# Altium footprint library ref-packages-longpad.PCBLIB: 1527 footprints (part 47 of 103)
Each footprint in its own frame and in the unit in brackets; x right, y up, seen from the top. Pads: shape width x height; smd on the part's side, far side on the other; paste and mask are expansions set on the pad; w line width, h text height; cw(c..) or ccw(c..) is an arc to the next point about the centre after c.
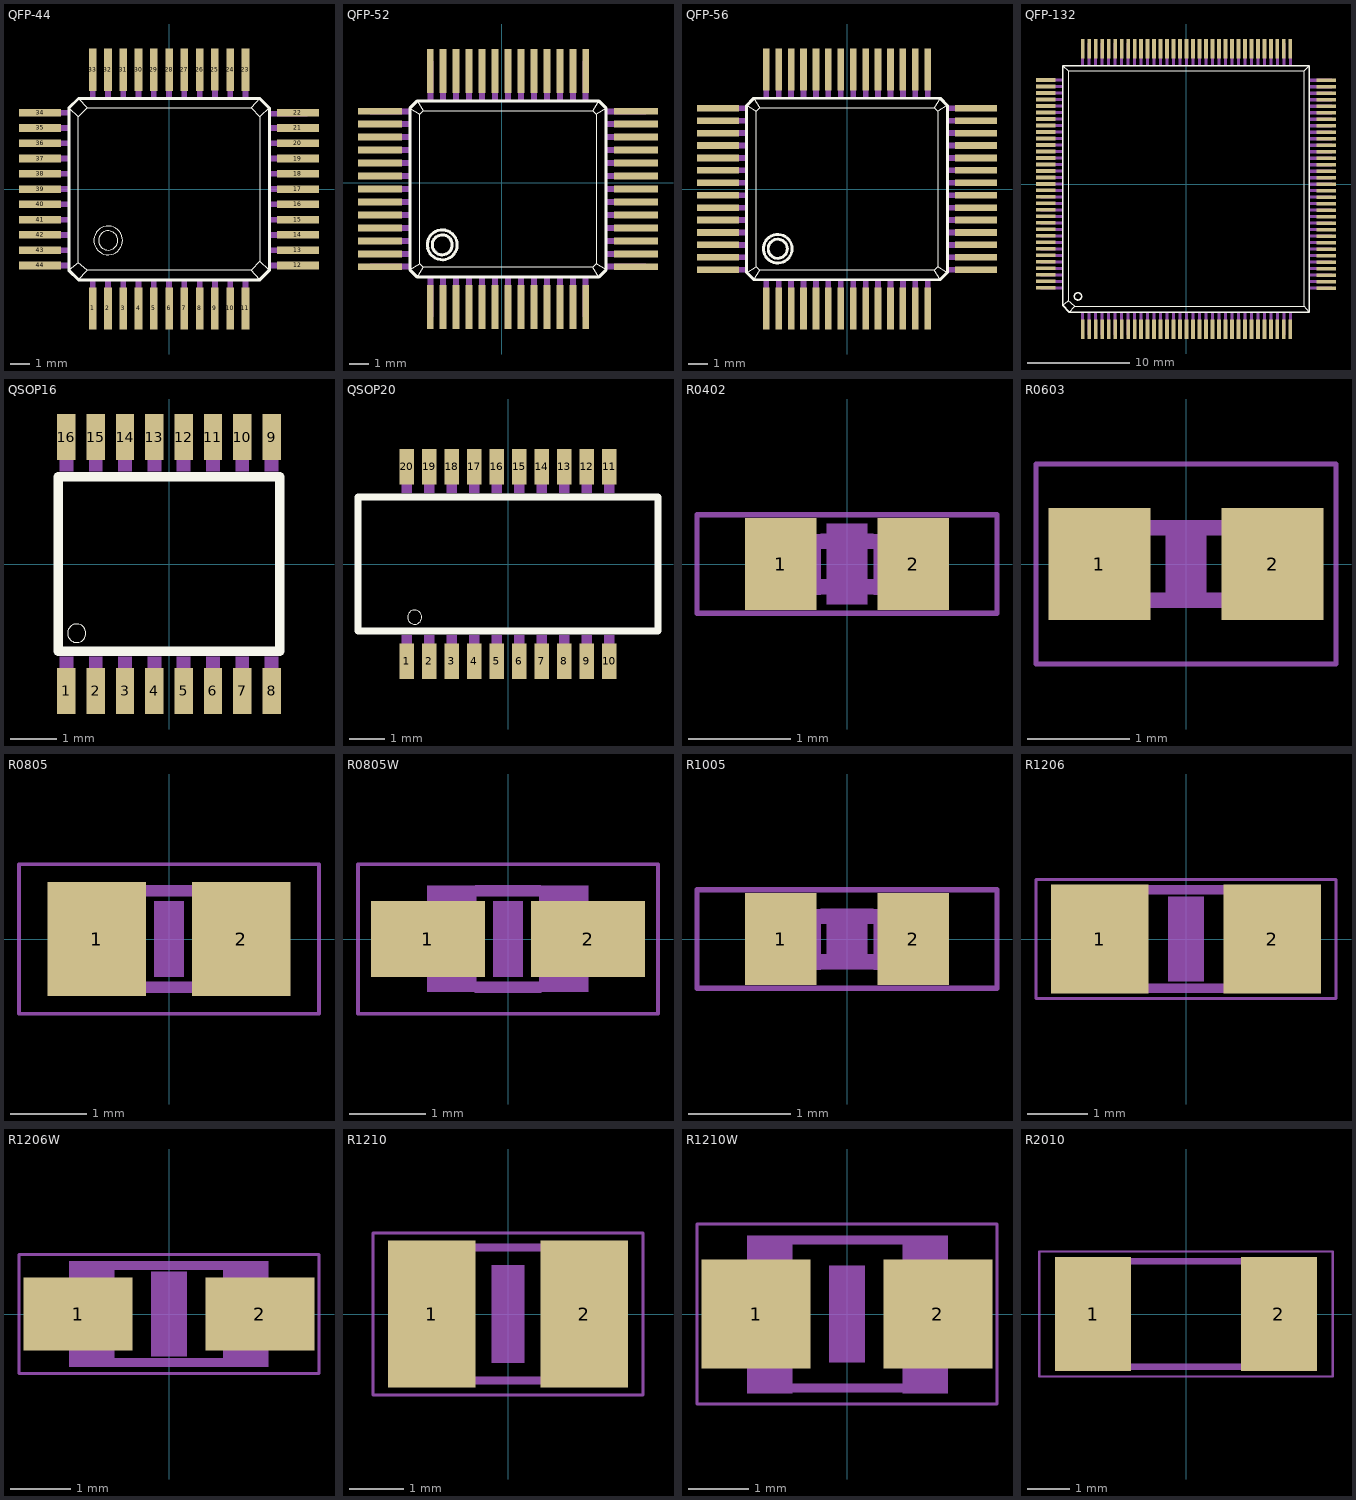
[diagram p46: the footprints below, top view; thin cyan lines are the x and y axes]

## QFP-44 [mm]
pads (44):
  rect 0.4x2.2 smd: 1(-4,-6.25) 2(-3.2,-6.25) 3(-2.4,-6.25) 4(-1.6,-6.25) 5(-0.8,-6.25) 6(0,-6.25) 7(0.8,-6.25) 8(1.6,-6.25) 9(2.4,-6.24) 10(3.2,-6.25) 11(4,-6.25) 23(4,6.25) 24(3.2,6.25) 25(2.4,6.26) 26(1.6,6.25) 27(0.8,6.25) 28(0,6.25) 29(-0.8,6.25) 30(-1.6,6.25) 31(-2.4,6.25) 32(-3.2,6.25) 33(-4,6.25)
  rect 2.2x0.4 smd: 12(6.75,-4) 13(6.75,-3.2) 14(6.75,-2.4) 15(6.75,-1.6) 16(6.75,-0.8) 17(6.75,0) 18(6.75,0.8) 19(6.75,1.6) 20(6.74,2.4) 21(6.75,3.2) 22(6.75,4) 34(-6.75,4) 35(-6.75,3.2) 36(-6.76,2.4) 37(-6.75,1.6) 38(-6.75,0.8) 39(-6.75,0) 40(-6.75,-0.8) 41(-6.75,-1.6) 42(-6.75,-2.4) 43(-6.75,-3.2) 44(-6.75,-4)
Top Overlay:
  circle w0.051: c-3.19,-2.69 r0.75
  circle w0.051: c-3.19,-2.69 r0.5
  lines w0.051: -5.25,-4.25 -4.75,-3.85 ; -5.25,4.25 -4.75,3.79 ; -4.75,-4.75 -4.29,-4.25 ; -4.75,4.75 -4.29,4.25 ; 4.75,-4.75 4.29,-4.25 ; 4.75,4.75 4.29,4.25 ; 5.25,-4.25 4.75,-3.79 ; 5.25,4.25 4.75,3.79 ; -4.75,-3.85 -4.75,3.79 ; -4.75,-3.85 -4.29,-4.25 ; -4.75,3.79 -4.29,4.25 ; -4.29,-4.25 4.29,-4.25 ; -4.29,4.25 4.29,4.25 ; 4.29,-4.25 4.75,-3.79 ; 4.29,4.25 4.75,3.79 ; 4.75,-3.79 4.75,3.79
  lines w0.152: -5.25,-4.25 -4.75,-4.75 4.75,-4.75 5.25,-4.25 5.25,4.25 4.75,4.75 -4.75,4.75 -5.25,4.25 -5.25,-4.25
Mechanical 16:
  rectangle: -4.15,4.75 -3.85,6.75
  rectangle: -3.35,4.75 -3.05,6.75
  rectangle: -2.55,4.75 -2.25,6.75
  rectangle: -1.75,4.75 -1.45,6.75
  rectangle: -0.95,4.75 -0.65,6.75
  rectangle: -0.15,4.75 0.15,6.75
  rectangle: 0.65,4.75 0.95,6.75
  rectangle: 1.45,4.75 1.75,6.75
  rectangle: 2.25,4.75 2.55,6.75
  rectangle: 3.05,4.75 3.35,6.75
  rectangle: 3.85,4.75 4.15,6.75
  rectangle: 5.25,3.79 7.25,4.09
  rectangle: 5.25,3.05 7.25,3.35
  rectangle: 5.25,2.25 7.25,2.55
  rectangle: 5.25,1.45 7.25,1.75
  rectangle: 5.25,0.65 7.25,0.95
  rectangle: 5.25,-0.15 7.25,0.15
  rectangle: 5.25,-0.95 7.25,-0.65
  rectangle: 5.25,-1.75 7.25,-1.45
  rectangle: 5.25,-2.55 7.25,-2.25
  rectangle: 5.25,-3.35 7.25,-3.05
  rectangle: 5.25,-4.15 7.25,-3.85
  rectangle: 3.85,-6.75 4.15,-4.75
  rectangle: 3.05,-6.75 3.35,-4.75
  rectangle: 2.25,-6.75 2.55,-4.75
  rectangle: 1.45,-6.75 1.75,-4.75
  rectangle: 0.65,-6.75 0.95,-4.75
  rectangle: -0.15,-6.75 0.15,-4.75
  rectangle: -0.95,-6.75 -0.65,-4.75
  rectangle: -1.75,-6.75 -1.45,-4.75
  rectangle: -2.55,-6.75 -2.25,-4.75
  rectangle: -3.35,-6.75 -3.05,-4.75
  rectangle: -4.15,-6.75 -3.85,-4.75
  rectangle: -7.25,-4.15 -5.25,-3.85
  rectangle: -7.25,-3.35 -5.25,-3.05
  rectangle: -7.25,-2.55 -5.25,-2.25
  rectangle: -7.25,-1.75 -5.25,-1.45
  rectangle: -7.25,-0.95 -5.25,-0.65
  rectangle: -7.25,-0.15 -5.25,0.15
  rectangle: -7.25,0.65 -5.25,0.95
  rectangle: -7.25,1.45 -5.25,1.75
  rectangle: -7.25,2.25 -5.25,2.55
  rectangle: -7.25,3.05 -5.25,3.35
  rectangle: -7.25,3.849 -5.25,4.149

## QFP-52 [mm]
pads (52):
  rect 0.35x2.2 smd: 1(-3.575,-6.25) 2(-2.925,-6.25) 3(-2.275,-6.25) 4(-1.625,-6.25) 5(-0.975,-6.25) 6(-0.325,-6.25) 7(0.325,-6.25) 8(0.975,-6.25) 9(1.625,-6.25) 10(2.275,-6.25) 11(2.925,-6.25) 12(3.575,-6.25) 13(4.225,-6.25) 27(4.225,5.6) 28(3.575,5.6) 29(2.925,5.6) 30(2.275,5.6) 31(1.625,5.6) 32(0.975,5.6) 33(0.325,5.6) 34(-0.325,5.6) 35(-0.975,5.6) 36(-1.625,5.6) 37(-2.275,5.6) 38(-2.925,5.6) 39(-3.575,5.6)
  rect 2.2x0.35 smd: 14(6.75,-4.225) 15(6.75,-3.575) 16(6.75,-2.925) 17(6.75,-2.275) 18(6.75,-1.625) 19(6.75,-0.975) 20(6.75,-0.325) 21(6.75,0.325) 22(6.75,0.975) 23(6.75,1.625) 24(6.75,2.275) 25(6.75,2.925) 26(6.75,3.575) 40(-6.1,3.575) 41(-6.1,2.925) 42(-6.1,2.275) 43(-6.1,1.625) 44(-6.1,0.975) 45(-6.1,0.325) 46(-6.1,-0.325) 47(-6.1,-0.975) 48(-6.1,-1.625) 49(-6.1,-2.275) 50(-6.1,-2.925) 51(-6.1,-3.575) 52(-6.1,-4.225)
Top Overlay:
  circle w0.152: c-2.974,-3.127 r0.75
  circle w0.152: c-2.974,-3.127 r0.501
  lines w0.051: -4.6,-4.375 -4.1,-4.075 ; -4.6,3.725 -4.1,3.425 ; -4.225,4.1 -3.925,3.6 ; -4.224,-4.751 -3.925,-4.25 ; 4.874,-4.751 4.575,-4.25 ; 4.875,4.1 4.575,3.6 ; 5.25,-4.375 4.75,-4.075 ; 5.25,3.725 4.75,3.425 ; -4.1,-4.075 -4.1,3.425 ; -4.1,-4.075 -3.925,-4.25 ; -4.1,3.425 -3.925,3.6 ; -3.925,-4.25 4.575,-4.25 ; -3.925,3.6 4.575,3.6 ; 4.575,-4.25 4.75,-4.075 ; 4.575,3.6 4.75,3.425 ; 4.75,-4.075 4.75,3.425
  lines w0.152: -4.6,-4.375 -4.6,3.725 -4.225,4.1 4.875,4.1 5.25,3.725 5.25,-4.375 4.874,-4.751 -4.224,-4.751 -4.6,-4.375
Mechanical 16:
  rectangle: -3.725,4.1 -3.425,6.1
  rectangle: -3.075,4.1 -2.775,6.1
  rectangle: -2.425,4.1 -2.125,6.1
  rectangle: -1.775,4.1 -1.475,6.1
  rectangle: -1.125,4.1 -0.825,6.1
  rectangle: -0.475,4.1 -0.175,6.1
  rectangle: 0.175,4.1 0.475,6.1
  rectangle: 0.825,4.1 1.125,6.1
  rectangle: 1.475,4.1 1.775,6.1
  rectangle: 2.125,4.1 2.425,6.1
  rectangle: 2.775,4.1 3.075,6.1
  rectangle: 3.425,4.1 3.725,6.1
  rectangle: 4.075,4.1 4.375,6.1
  rectangle: 5.25,3.425 7.25,3.725
  rectangle: 5.25,2.775 7.25,3.075
  rectangle: 5.25,2.125 7.25,2.425
  rectangle: 5.25,1.475 7.25,1.775
  rectangle: 5.25,0.825 7.25,1.125
  rectangle: 5.25,0.175 7.25,0.475
  rectangle: 5.25,-0.475 7.25,-0.175
  rectangle: 5.25,-1.125 7.25,-0.825
  rectangle: 5.25,-1.775 7.25,-1.475
  rectangle: 5.25,-2.425 7.25,-2.125
  rectangle: 5.25,-3.075 7.25,-2.775
  rectangle: 5.25,-3.725 7.25,-3.425
  rectangle: 5.25,-4.375 7.25,-4.075
  rectangle: -6.6,-4.375 -4.6,-4.075
  rectangle: -6.6,-3.725 -4.6,-3.425
  rectangle: -6.6,-3.075 -4.6,-2.775
  rectangle: -6.6,-2.425 -4.6,-2.125
  rectangle: -6.6,-1.775 -4.6,-1.475
  rectangle: -6.6,-1.125 -4.6,-0.825
  rectangle: -6.6,-0.475 -4.6,-0.175
  rectangle: -6.6,0.175 -4.6,0.475
  rectangle: -6.6,0.825 -4.6,1.125
  rectangle: -6.6,1.475 -4.6,1.775
  rectangle: -6.6,2.125 -4.6,2.425
  rectangle: -6.6,2.775 -4.6,3.075
  rectangle: -6.6,3.425 -4.6,3.725
  rectangle: 4.075,-6.751 4.375,-4.751
  rectangle: 3.425,-6.751 3.725,-4.751
  rectangle: 2.775,-6.751 3.075,-4.751
  rectangle: 2.125,-6.751 2.425,-4.751
  rectangle: 1.475,-6.751 1.775,-4.751
  rectangle: 0.825,-6.751 1.125,-4.751
  rectangle: 0.175,-6.751 0.475,-4.751
  rectangle: -0.475,-6.751 -0.175,-4.751
  rectangle: -1.125,-6.751 -0.825,-4.751
  rectangle: -1.775,-6.751 -1.475,-4.751
  rectangle: -2.425,-6.751 -2.125,-4.751
  rectangle: -3.075,-6.751 -2.775,-4.751
  rectangle: -3.725,-6.751 -3.425,-4.751

## QFP-56 [mm]
pads (56):
  rect 0.35x2.2 smd: 1(-4.225,-6.25) 2(-3.575,-6.25) 3(-2.925,-6.25) 4(-2.275,-6.25) 5(-1.625,-6.25) 6(-0.975,-6.25) 7(-0.325,-6.25) 8(0.325,-6.25) 9(0.975,-6.25) 10(1.625,-6.25) 11(2.275,-6.25) 12(2.925,-6.25) 13(3.575,-6.25) 14(4.225,-6.25) 29(4.225,6.25) 30(3.575,6.25) 31(2.925,6.25) 32(2.275,6.25) 33(1.625,6.25) 34(0.975,6.25) 35(0.325,6.25) 36(-0.325,6.25) 37(-0.975,6.25) 38(-1.625,6.25) 39(-2.275,6.25) 40(-2.925,6.25) 41(-3.575,6.25) 42(-4.225,6.25)
  rect 2.2x0.35 smd: 15(6.75,-4.225) 16(6.75,-3.575) 17(6.75,-2.925) 18(6.75,-2.275) 19(6.75,-1.625) 20(6.75,-0.975) 21(6.75,-0.325) 22(6.75,0.325) 23(6.75,0.975) 24(6.75,1.625) 25(6.75,2.275) 26(6.75,2.925) 27(6.75,3.575) 28(6.75,4.225) 43(-6.75,4.225) 44(-6.75,3.575) 45(-6.75,2.925) 46(-6.75,2.275) 47(-6.75,1.625) 48(-6.75,0.975) 49(-6.75,0.325) 50(-6.75,-0.325) 51(-6.75,-0.975) 52(-6.75,-1.625) 53(-6.75,-2.275) 54(-6.75,-2.925) 55(-6.75,-3.575) 56(-6.75,-4.225)
Top Overlay:
  circle w0.152: c-3.624,-3.127 r0.75
  circle w0.152: c-3.624,-3.127 r0.501
  lines w0.051: -5.25,-4.375 -4.75,-4.075 ; -5.25,4.375 -4.75,4.075 ; -4.875,4.75 -4.575,4.25 ; -4.874,-4.751 -4.575,-4.25 ; 4.874,-4.751 4.575,-4.25 ; 4.875,4.75 4.575,4.25 ; 5.25,-4.375 4.75,-4.075 ; 5.25,4.375 4.75,4.075 ; -4.75,-4.075 -4.75,4.075 ; -4.75,-4.075 -4.575,-4.25 ; -4.75,4.075 -4.575,4.25 ; -4.575,-4.25 4.575,-4.25 ; -4.575,4.25 4.575,4.25 ; 4.575,-4.25 4.75,-4.075 ; 4.575,4.25 4.75,4.075 ; 4.75,-4.075 4.75,4.075
  lines w0.152: -5.25,-4.375 -5.25,4.375 -4.875,4.75 4.875,4.75 5.25,4.375 5.25,-4.375 4.874,-4.751 -4.874,-4.751 -5.25,-4.375
Mechanical 16:
  rectangle: -4.375,4.75 -4.075,6.75
  rectangle: -3.725,4.75 -3.425,6.75
  rectangle: -3.075,4.75 -2.775,6.75
  rectangle: -2.425,4.75 -2.125,6.75
  rectangle: -1.775,4.75 -1.475,6.75
  rectangle: -1.125,4.75 -0.825,6.75
  rectangle: -0.475,4.75 -0.175,6.75
  rectangle: 0.175,4.75 0.475,6.75
  rectangle: 0.825,4.75 1.125,6.75
  rectangle: 1.475,4.75 1.775,6.75
  rectangle: 2.125,4.75 2.425,6.75
  rectangle: 2.775,4.75 3.075,6.75
  rectangle: 3.425,4.75 3.725,6.75
  rectangle: 4.075,4.75 4.375,6.75
  rectangle: 5.25,4.075 7.25,4.375
  rectangle: 5.25,3.425 7.25,3.725
  rectangle: 5.25,2.775 7.25,3.075
  rectangle: 5.25,2.125 7.25,2.425
  rectangle: 5.25,1.475 7.25,1.775
  rectangle: 5.25,0.825 7.25,1.125
  rectangle: 5.25,0.175 7.25,0.475
  rectangle: 5.25,-0.475 7.25,-0.175
  rectangle: 5.25,-1.125 7.25,-0.825
  rectangle: 5.25,-1.775 7.25,-1.475
  rectangle: 5.25,-2.425 7.25,-2.125
  rectangle: 5.25,-3.075 7.25,-2.775
  rectangle: 5.25,-3.725 7.25,-3.425
  rectangle: 5.25,-4.375 7.25,-4.075
  rectangle: -7.25,-4.375 -5.25,-4.075
  rectangle: -7.25,-3.725 -5.25,-3.425
  rectangle: -7.25,-3.075 -5.25,-2.775
  rectangle: -7.25,-2.425 -5.25,-2.125
  rectangle: -7.25,-1.775 -5.25,-1.475
  rectangle: -7.25,-1.125 -5.25,-0.825
  rectangle: -7.25,-0.475 -5.25,-0.175
  rectangle: -7.25,0.175 -5.25,0.475
  rectangle: -7.25,0.825 -5.25,1.125
  rectangle: -7.25,1.475 -5.25,1.775
  rectangle: -7.25,2.125 -5.25,2.425
  rectangle: -7.25,2.775 -5.25,3.075
  rectangle: -7.25,3.425 -5.25,3.725
  rectangle: -7.25,4.075 -5.25,4.375
  rectangle: 4.075,-6.751 4.375,-4.751
  rectangle: 3.425,-6.751 3.725,-4.751
  rectangle: 2.775,-6.751 3.075,-4.751
  rectangle: 2.125,-6.751 2.425,-4.751
  rectangle: 1.475,-6.751 1.775,-4.751
  rectangle: 0.825,-6.751 1.125,-4.751
  rectangle: 0.175,-6.751 0.475,-4.751
  rectangle: -0.475,-6.751 -0.175,-4.751
  rectangle: -1.125,-6.751 -0.825,-4.751
  rectangle: -1.775,-6.751 -1.475,-4.751
  rectangle: -2.425,-6.751 -2.125,-4.751
  rectangle: -3.075,-6.751 -2.775,-4.751
  rectangle: -3.725,-6.751 -3.425,-4.751
  rectangle: -4.375,-6.751 -4.075,-4.751

## QFP-132 [mil]
pads (132):
  rect 14x75 smd: 1(-399,-557) 2(-374,-557) 3(-349,-557) 4(-324,-557) 5(-299,-557) 6(-274,-557) 7(-249,-557) 8(-224,-557) 9(-199,-557) 10(-174,-557) 11(-149,-557) 12(-124,-557) 13(-99,-557) 14(-74,-557) 15(-49,-557) 16(-24,-557) 17(1,-557) 18(26,-557) 19(51,-557) 20(76,-557) 21(101,-557) 22(126,-557) 23(151,-557) 24(176,-557) 25(201,-557) 26(226,-557) 27(251,-557) 28(276,-557) 29(301,-557) 30(326,-557) 31(351,-557) 32(376,-557) 33(401,-557) 67(401,522) 68(376,522) 69(351,522) 70(326,522) 71(301,522) 72(276,522) 73(251,522) 74(226,522) 75(201,522) 76(176,522) 77(151,522) 78(126,522) 79(101,522) 80(76,522) 81(51,522) 82(26,522) 83(1,522) 84(-24,522) 85(-49,522) 86(-74,522) 87(-99,522) 88(-124,522) 89(-149,522) 90(-174,522) 91(-199,522) 92(-224,522) 93(-249,522) 94(-274,522) 95(-299,522) 96(-324,522) 97(-349,522) 98(-374,522) 99(-399,522)
  rect 75x14 smd: 34(539,-399) 35(539,-374) 36(539,-349) 37(539,-324) 38(539,-299) 39(539,-274) 40(539,-249) 41(539,-224) 42(539,-199) 43(539,-174) 44(539,-149) 45(539,-124) 46(539,-99) 47(539,-74) 48(539,-49) 49(539,-24) 50(539,1) 51(539,26) 52(539,51) 53(539,76) 54(539,101) 55(539,126) 56(539,151) 57(539,176) 58(539,201) 59(539,226) 60(539,251) 61(539,276) 62(539,301) 63(539,326) 64(539,351) 65(539,376) 66(539,401) 100(-541,402) 101(-541,377) 102(-541,352) 103(-541,327) 104(-541,302) 105(-541,277) 106(-541,252) 107(-541,227) 108(-541,202) 109(-541,177) 110(-541,152) 111(-541,127) 112(-541,102) 113(-541,77) 114(-541,52) 115(-541,27) 116(-541,2) 117(-541,-23) 118(-541,-48) 119(-541,-73) 120(-541,-98) 121(-541,-123) 122(-541,-148) 123(-541,-173) 124(-541,-198) 125(-541,-223) 126(-541,-248) 127(-541,-273) 128(-541,-298) 129(-541,-323) 130(-541,-348) 131(-541,-373) 132(-541,-398)
Top Overlay:
  circle w6: c-417,-431 r14
  lines w2: -475,-465 -454,-448 ; -475,457 -454,437 ; -450,-492 -430,-469 ; 474,-492 455,-469 ; 474,457 455,437 ; -454,-448 -454,437 ; -454,-448 -430,-469 ; -454,437 455,437 ; -430,-469 455,-469 ; 455,-469 455,437
  lines w6: -475,-465 -475,457 474,457 474,-492 -450,-492 -475,-465
Mechanical 16:
  rectangle: 476,395 561,407
  rectangle: 476,370 561,382
  rectangle: 476,345 561,357
  rectangle: 476,320 561,332
  rectangle: 476,295 561,307
  rectangle: 476,270 561,282
  rectangle: 476,245 561,257
  rectangle: 476,220 561,232
  rectangle: 476,195 561,207
  rectangle: 476,170 561,182
  rectangle: 476,145 561,157
  rectangle: 476,120 561,132
  rectangle: 476,95 561,107
  rectangle: 476,70 561,82
  rectangle: 476,45 561,57
  rectangle: 476,20 561,32
  rectangle: 476,-5 561,7
  rectangle: 476,-30 561,-18
  rectangle: 476,-55 561,-43
  rectangle: 476,-80 561,-68
  rectangle: 476,-105 561,-93
  rectangle: 476,-130 561,-118
  rectangle: 476,-155 561,-143
  rectangle: 476,-180 561,-168
  rectangle: 476,-205 561,-193
  rectangle: 476,-230 561,-218
  rectangle: 476,-255 561,-243
  rectangle: 476,-280 561,-268
  rectangle: 476,-305 561,-293
  rectangle: 476,-330 561,-318
  rectangle: 476,-355 561,-343
  rectangle: 476,-380 561,-368
  rectangle: 476,-405 561,-393
  rectangle: 320,459 332,544
  rectangle: 295,459 307,544
  rectangle: 270,459 282,544
  rectangle: 245,459 257,544
  rectangle: 220,459 232,544
  rectangle: 195,459 207,544
  rectangle: 170,459 182,544
  rectangle: 145,459 157,544
  rectangle: 120,459 132,544
  rectangle: 95,459 107,544
  rectangle: 70,459 82,544
  rectangle: 45,459 57,544
  rectangle: 20,459 32,544
  rectangle: -5,459 7,544
  rectangle: -30,459 -18,544
  rectangle: -55,459 -43,544
  rectangle: -80,459 -68,544
  rectangle: -105,459 -93,544
  rectangle: -130,459 -118,544
  rectangle: -155,459 -143,544
  rectangle: -180,459 -168,544
  rectangle: -205,459 -193,544
  rectangle: -230,459 -218,544
  rectangle: -255,459 -243,544
  rectangle: -280,459 -268,544
  rectangle: -305,459 -293,544
  rectangle: -330,459 -318,544
  rectangle: -355,459 -343,544
  rectangle: -380,459 -368,544
  rectangle: -405,459 -393,544
  rectangle: 345,459 357,544
  rectangle: 370,459 382,544
  rectangle: 395,459 407,544
  rectangle: -562,396 -477,408
  rectangle: -562,371 -477,383
  rectangle: -562,346 -477,358
  rectangle: -562,321 -477,333
  rectangle: -562,296 -477,308
  rectangle: -562,271 -477,283
  rectangle: -562,246 -477,258
  rectangle: -562,221 -477,233
  rectangle: -562,196 -477,208
  rectangle: -562,171 -477,183
  rectangle: -562,146 -477,158
  rectangle: -562,121 -477,133
  rectangle: -562,96 -477,108
  rectangle: -562,71 -477,83
  rectangle: -562,46 -477,58
  rectangle: -562,21 -477,33
  rectangle: -562,-4 -477,8
  rectangle: -562,-29 -477,-17
  rectangle: -562,-54 -477,-42
  rectangle: -562,-79 -477,-67
  rectangle: -562,-104 -477,-92
  rectangle: -562,-129 -477,-117
  rectangle: -562,-154 -477,-142
  rectangle: -562,-179 -477,-167
  rectangle: -562,-204 -477,-192
  rectangle: -562,-229 -477,-217
  rectangle: -562,-254 -477,-242
  rectangle: -562,-279 -477,-267
  rectangle: -562,-304 -477,-292
  rectangle: -562,-329 -477,-317
  rectangle: -562,-354 -477,-342
  rectangle: -562,-379 -477,-367
  rectangle: -562,-404 -477,-392
  rectangle: 395,-579 407,-494
  rectangle: 370,-579 382,-494
  rectangle: 345,-579 357,-494
  rectangle: 320,-579 332,-494
  rectangle: 295,-579 307,-494
  rectangle: 270,-579 282,-494
  rectangle: 245,-579 257,-494
  rectangle: 220,-579 232,-494
  rectangle: 195,-579 207,-494
  rectangle: 170,-579 182,-494
  rectangle: 145,-579 157,-494
  rectangle: 120,-579 132,-494
  rectangle: 95,-579 107,-494
  rectangle: 70,-579 82,-494
  rectangle: 45,-579 57,-494
  rectangle: 20,-579 32,-494
  rectangle: -5,-579 7,-494
  rectangle: -30,-579 -18,-494
  rectangle: -55,-579 -43,-494
  rectangle: -80,-579 -68,-494
  rectangle: -105,-579 -93,-494
  rectangle: -130,-579 -118,-494
  rectangle: -155,-579 -143,-494
  rectangle: -180,-579 -168,-494
  rectangle: -205,-579 -193,-494
  rectangle: -230,-579 -218,-494
  rectangle: -255,-579 -243,-494
  rectangle: -280,-579 -268,-494
  rectangle: -305,-579 -293,-494
  rectangle: -330,-579 -318,-494
  rectangle: -355,-579 -343,-494
  rectangle: -380,-579 -368,-494
  rectangle: -405,-579 -393,-494

## QSOP16 [mm]
pads (16):
  rect 0.4x1 smd: 1(-2.223,-2.75) 2(-1.588,-2.75) 3(-0.953,-2.75) 4(-0.318,-2.75) 5(0.318,-2.75) 6(0.953,-2.75) 7(1.588,-2.75) 8(2.223,-2.75) 9(2.223,2.75) 10(1.588,2.75) 11(0.953,2.75) 12(0.318,2.75) 13(-0.318,2.75) 14(-0.953,2.75) 15(-1.588,2.75) 16(-2.223,2.75)
Top Overlay:
  circle w0: c-2,-1.5 r0.2
  lines w0.203: -2.4,-1.89 -2.4,1.89 ; -2.38,-1.89 2.4,-1.89 2.4,1.89 -2.38,1.89
Mechanical 16:
  rectangle: -2.373,-3.1 -2.072,-2
  rectangle: -1.738,-3.1 -1.437,-2
  rectangle: -1.103,-3.1 -0.802,-2
  rectangle: -0.468,-3.1 -0.167,-2
  rectangle: 0.167,-3.1 0.468,-2
  rectangle: 0.802,-3.1 1.103,-2
  rectangle: 1.437,-3.1 1.738,-2
  rectangle: 2.072,-3.1 2.373,-2
  rectangle: 2.072,2 2.373,3.1
  rectangle: 1.437,2 1.738,3.1
  rectangle: 0.802,2 1.103,3.1
  rectangle: 0.167,2 0.468,3.1
  rectangle: -0.468,2 -0.167,3.1
  rectangle: -1.103,2 -0.802,3.1
  rectangle: -1.738,2 -1.437,3.1
  rectangle: -2.373,2 -2.072,3.1

## QSOP20 [mm]
pads (20):
  rect 0.4x1 smd: 1(-2.858,-2.75) 2(-2.223,-2.75) 3(-1.588,-2.75) 4(-0.953,-2.75) 5(-0.318,-2.75) 6(0.318,-2.75) 7(0.953,-2.75) 8(1.588,-2.75) 9(2.223,-2.75) 10(2.858,-2.75) 11(2.858,2.75) 12(2.223,2.75) 13(1.588,2.75) 14(0.953,2.75) 15(0.318,2.75) 16(-0.318,2.75) 17(-0.953,2.75) 18(-1.588,2.75) 19(-2.223,2.75) 20(-2.858,2.75)
Top Overlay:
  circle w0: c-2.635,-1.5 r0.2
  lines w0.203: -4.235,-1.89 4.235,-1.89 4.235,1.89 -4.235,1.89 -4.235,-1.89
Mechanical 16:
  rectangle: -3.008,-3.1 -2.707,-2
  rectangle: -2.373,-3.1 -2.072,-2
  rectangle: -1.738,-3.1 -1.437,-2
  rectangle: -1.103,-3.1 -0.802,-2
  rectangle: -0.468,-3.1 -0.167,-2
  rectangle: 0.167,-3.1 0.468,-2
  rectangle: 0.802,-3.1 1.103,-2
  rectangle: 1.437,-3.1 1.738,-2
  rectangle: 2.072,-3.1 2.373,-2
  rectangle: 2.707,-3.1 3.008,-2
  rectangle: 2.707,2 3.008,3.1
  rectangle: 2.072,2 2.373,3.1
  rectangle: 1.437,2 1.738,3.1
  rectangle: 0.802,2 1.103,3.1
  rectangle: 0.167,2 0.468,3.1
  rectangle: -0.468,2 -0.167,3.1
  rectangle: -1.103,2 -0.802,3.1
  rectangle: -1.738,2 -1.437,3.1
  rectangle: -2.373,2 -2.072,3.1
  rectangle: -3.008,2 -2.707,3.1

## R0402 [mm]
pads (2):
  rect 0.7x0.9 smd: 1(-0.65,0) 2(0.65,0)
Mechanical 6:
  rectangle: -0.2,-0.4 0.2,0.4
Mechanical 16:
  rectangle: -0.554,-0.305 -0.254,0.295
  rectangle: 0.259,-0.305 0.559,0.295
  lines w0.152: -0.245,-0.224 0.245,-0.224 ; -0.245,0.224 0.245,0.224
Mechanical 27:
  lines w0.051: -1.473,-0.483 1.473,-0.483 1.473,0.483 -1.473,0.483 -1.473,-0.483

## R0603 [mm]
pads (2):
  rect 1x1.1 smd: 1(-0.85,0) 2(0.85,0)
Mechanical 6:
  rectangle: -0.2,-0.4 0.2,0.4
Mechanical 16:
  rectangle: 0.432,-0.432 0.838,0.432
  rectangle: -0.838,-0.432 -0.432,0.432
  lines w0.152: -0.432,-0.356 0.432,-0.356 ; -0.432,0.356 0.432,0.356
Mechanical 27:
  lines w0.051: -1.473,-0.983 1.473,-0.983 1.473,0.983 -1.473,0.983 -1.473,-0.983

## R0805 [mil]
pads (2):
  rect 51.18x59.06 smd: 1(-37.4,0) 2(37.4,0)
Mechanical 6:
  rectangle: -7.87,-19.69 7.87,19.69
Mechanical 16:
  rectangle: 16,-27.5 41.59,27.62
  rectangle: -42,-27.5 -16.41,27.62
  lines w6: -16.14,-25 16.14,-25 ; -16.14,25 16.14,25
Mechanical 27:
  lines w2: -77.68,-38.7 77.68,-38.7 77.68,38.7 -77.68,38.7 -77.68,-38.7

## R0805W [mm]
pads (2):
  rect 1.5x1 smd: 1(-1.053,0) 2(1.053,0)
Mechanical 6:
  rectangle: -0.2,-0.5 0.2,0.5
Mechanical 16:
  rectangle: 0.406,-0.699 1.056,0.702
  rectangle: -1.067,-0.699 -0.417,0.702
  lines w0.152: -0.41,-0.635 0.41,-0.635 ; -0.41,0.635 0.41,0.635
Mechanical 27:
  lines w0.051: -1.973,-0.983 1.973,-0.983 1.973,0.983 -1.973,0.983 -1.973,-0.983

## R1005 [mm]
pads (2):
  rect 0.7x0.9 smd: 1(-0.65,0) 2(0.65,0)
Mechanical 6:
  rectangle: -0.2,-0.3 0.2,0.3
Mechanical 16:
  rectangle: -0.554,-0.305 -0.254,0.295
  rectangle: 0.259,-0.305 0.559,0.295
  lines w0.152: -0.245,-0.224 0.245,-0.224 ; -0.245,0.224 0.245,0.224
Mechanical 27:
  lines w0.051: -1.473,-0.483 1.473,-0.483 1.473,0.483 -1.473,0.483 -1.473,-0.483

## R1206 [mil]
pads (2):
  rect 62.99x70.98 smd: 1(-55.98,0) 2(55.98,0)
Mechanical 6:
  rectangle: -11.81,-27.56 11.81,27.56
Mechanical 16:
  rectangle: -66.5,-34.5 -37.5,34.5
  rectangle: 37.5,-34.5 66.5,34.5
  lines w6: -38,-32 37.5,-32 ; -38,32 37.5,32
Mechanical 27:
  lines w2: -97.36,-38.7 97.36,-38.7 97.36,38.7 -97.36,38.7 -97.36,-38.7

## R1206W [mil]
pads (2):
  rect 70.87x47.24 smd: 1(-59.02,0) 2(59.02,0)
Mechanical 6:
  rectangle: -11.81,-27.56 11.81,27.56
Mechanical 16:
  rectangle: -65,-34.5 -35.47,34.4
  rectangle: 35,-34.5 64.53,34.4
  lines w6: -35.94,-31.5 34.96,-31.5 ; -35.94,31.5 34.96,31.5
Mechanical 27:
  lines w2: -97.36,-38.7 97.36,-38.7 97.36,38.7 -97.36,38.7 -97.36,-38.7

## R1210 [mil]
pads (2):
  rect 62.99x106.3 smd: 1(-55.12,0) 2(55.12,0)
Mechanical 6:
  rectangle: -11.81,-35.43 11.81,35.43
Mechanical 16:
  rectangle: -65,-51.5 -35.47,50.86
  rectangle: 36,-51.5 65.53,50.86
  lines w6: -35.94,-47.99 36.97,-47.99 ; -35.94,47.99 36.97,47.99
Mechanical 27:
  lines w2: -97.36,-58.39 97.36,-58.39 97.36,58.39 -97.36,58.39 -97.36,-58.39

## R1210W [mil]
pads (2):
  rect 70.87x70.87 smd: 1(-59.02,0) 2(59.02,0)
Mechanical 6:
  rectangle: -11.81,-31.5 11.81,31.5
Mechanical 16:
  rectangle: -65,-51.5 -35.47,50.86
  rectangle: 36,-51.5 65.53,50.86
  lines w6: -35.94,-47.99 36.97,-47.99 ; -35.94,47.99 36.97,47.99
Mechanical 27:
  lines w2: -97.36,-58.39 97.36,-58.39 97.36,58.39 -97.36,58.39 -97.36,-58.39

## R2010 [mil]
pads (2):
  rect 70.87x106.3 smd: 1(-86.61,0) 2(86.61,0)
Mechanical 16:
  rectangle: -98,-52 -64.54,52.33
  rectangle: 65,-52 98.46,52.33
  lines w6: -65.43,49.02 65.43,49.02 ; -64.45,-49.02 66.42,-49.02
Mechanical 27:
  lines w2: -136.73,-58.39 136.73,-58.39 136.73,58.39 -136.73,58.39 -136.73,-58.39